# Altium schematic symbol library my Library.SchLib: 808 symbols (part 1 of 6) (continued)
## 74245 (continued)

## 74573
designator IC?, comment 74HC573
Octal D-Type Latch with 3-State Output Non-Inverting; Value: 74HC573; Copyright by: VanDungEvn@Gmail.com
footprint DIP20/W0.3 (DIP 20, 20 PIN, W 300mil.)
pins: 1 ~{OE} (in), 2 D1 (in), 3 D2 (in), 4 D3 (in), 5 D4 (in), 6 D5 (in), 7 D6 (in), 8 D7 (in), 9 D8 (in), 10 GND (power) hidden to GND, 11 LE (in), 12 Q8 (hiz), 13 Q7 (hiz), 14 Q6 (hiz), 15 Q5 (hiz), 16 Q4 (hiz), 17 Q3 (hiz), 18 Q2 (hiz), 19 Q1 (hiz), 20 VCC (power) hidden to VCC

## 74595
designator IC?, comment 74HC595
8 Bit Serial input - Parallel Output; Value: 74HC595
footprint DIP16/W0.3 (16 PIN, W 300mil, Pin to pin 100mil)
footprint SO-16 (SOIC, 16-Leads, Body 9.9x3.9mm, Pitch 1.27mm, IPC Low Density)
footprint HC595_SOP127P600X175-16N (SOP, 16-Leads, Body 9.90x3.90mm, Pitch 1.27mm, IPC Medium Density)
pins: 1 QB, 2 QC, 3 QD, 4 QE, 5 QF, 6 QG, 7 QH, 8 GND hidden to GND, 9 SQH "OUTPUT", 10 ~{MR} "OUTPUT", 11 SCK "OUTPUT", 12 LAT "OUTPUT", 13 ~{OE} "OUTPUT", 14 SDA "OUTPUT", 15 QA, 16 VCC hidden to VCC

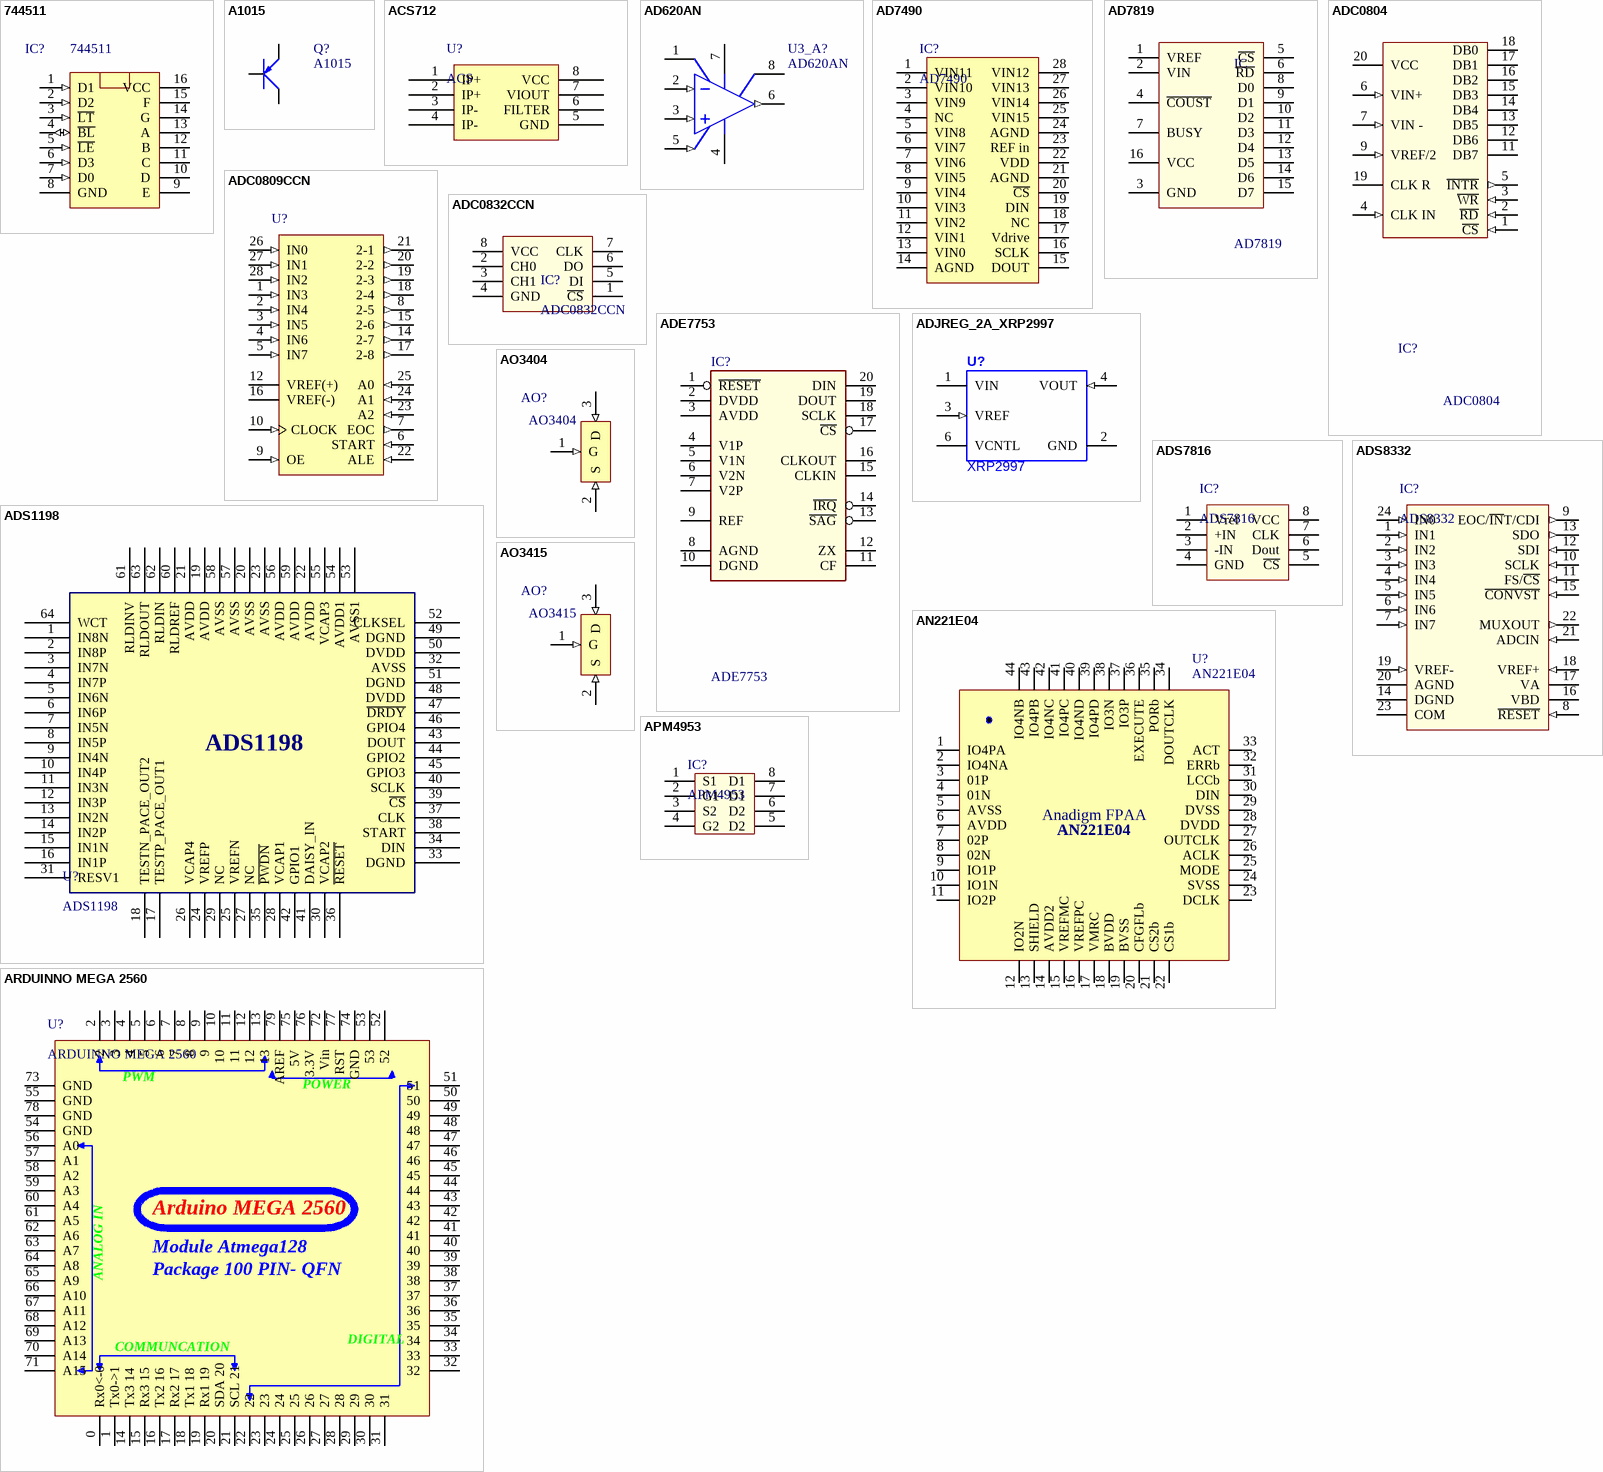
[diagram p2: symbols 744511 to ARDUINNO MEGA 2560]

## 744511
designator IC?
BCD to 7-Segment Decoder/Driver; Value: 7447 , 74247
footprint DIP16/W0.3 (16 PIN, W 300mil, Pin to pin 100mil)
pins: 1 D1 (in), 2 D2 (in), 3 ~{LT} (in), 4 ~{BL} (io), 5 ~{LE} (in), 6 D3 (in), 7 D0 (in), 8 GND (power), 9 E (oc), 10 D (oc), 11 C (oc), 12 B (oc), 13 A (oc), 14 G (oc), 15 F (oc), 16 VCC (power)

## A1015
designator Q?
PNP 600mW, ECB; Value: A1015
footprint QTO-92 (TO-92)
footprint SOT23B (SOT 23B)
pins: 1 E, 2 C, 3 B

## ACS712
designator U?, comment ACS
footprint DIP.100/8/W.300/L.400
footprint acs712 (SOIC, 8-Leads, Body 4.90x3.90mm, Pitch 1.27mm, IPC Medium Density)
pins: 1 IP+, 2 IP+, 3 IP-, 4 IP-, 5 GND, 6 FILTER, 7 VIOUT, 8 VCC

## AD620AN
designator U3_A?
Low-Cost, Low-Power Instrumentation Amplifier; Published: 8-Jun-2000; LatestRevisionDate: 04-Mar-2005; LatestRevisionNote: Stylized 3D Model Added.; DatasheetVersion: REV.D 1998; PackageVersion: revA; PackageReference: N-8; Publisher: Altium Limited; PackageDescription: DIP; 8 Leads; Row Spacing 7.62 mm; Pitch 2.54 mm; ComponentLink1Description: Manufacturer Link; ComponentLink1URL: http://www.analog.com/en/prod/0%2C2877%2CAD620%2C00.html; ComponentLink2Description: Datasheet; ComponentLink2URL: http://www.analog.com/UploadedFiles/Data_Sheets/897653854AD620_g.pdf
footprint DIP.100/8/W.300/L.400
footprint soic-8n
pins: 1 RG, 2 -IN (in), 3 +IN (in), 4 V- (power), 5 REF (in), 6 OUT (out), 7 V+ (power), 8 RG

## AD7490
designator IC?
16-Channel, 1 MSPS, 12-Bit ADC  with Sequencer in 28-Lead TSSOP
footprint TSOP65P640X120-28N (TSOP, 28-Leads, Body 9.7x4.4mm (max), Pitch 0.65mm, IPC Medium Density)
pins: 1 VIN11, 2 VIN10, 3 VIN9, 4 NC, 5 VIN8, 6 VIN7, 7 VIN6, 8 VIN5, 9 VIN4, 10 VIN3, 11 VIN2, 12 VIN1, 13 VIN0, 14 AGND, 15 DOUT, 16 SCLK, 17 Vdrive, 18 NC, 19 DIN, 20 ~{CS}, 21 AGND, 22 VDD, 23 REF in, 24 AGND, 25 VIN15, 26 VIN14, 27 VIN13, 28 VIN12

## AD7819
designator IC
8 bit A/D  Converter; Value: AD7819
footprint DIP16/W0.3 (16 PIN, W 300mil)
pins: 1 VREF, 2 VIN, 3 GND, 4 ~{COUST}, 5 ~{CS}, 6 ~{RD}, 7 BUSY, 8 D0, 9 D1, 10 D2, 11 D3, 12 D4, 13 D5, 14 D6, 15 D7, 16 VCC

## ADC0804
designator IC?
8-Bit A/D Converter (01-05); Value: ADC0804
footprint DIP20/W0.3 (DIP 20, 20 PIN, W 300mil, Pin to pin 100mil)
pins: 1 ~{CS} (in), 2 ~{RD} (in), 3 ~{WR} (in), 4 CLK IN (in), 5 ~{INTR} (out), 6 VIN+ (in), 7 VIN - (in), 8 AGND (power) hidden to GND, 9 VREF/2 (in), 10 DGND (power) hidden to GND, 11 DB7 (hiz), 12 DB6 (hiz), 13 DB5 (hiz), 14 DB4 (hiz), 15 DB3 (hiz), 16 DB2 (hiz), 17 DB1 (hiz), 18 DB0 (hiz), 19 CLK R, 20 VCC (power)

## ADC0809CCN
designator U?
8-bit Microprocessor Compatible A/D Converters With 8-Channel Multiplexer; PartNumber: ADC0809CCN; Manufacturer: National Semiconductor; CompType: ADC IC; PackageTopMarking: NSUZXYYTTE#*ADC0809CCN; Published: 27-Nov-2008; DatasheetVersion: Sep-1992; PackageVersion: revB, Aug-1993; PackageReference: NA28E; Publisher: Altium Limited; PackageDescription: Molded Dip, 28 Lead, .600 Centers, Substractor Package; RoHS: O; PinCount: 28; DigiKeyPartNumber: ADC0809CCN-ND; ComponentLink1Description: ADC0809 Datasheet; ComponentLink1URL: http://www.national.com/ds/AD/ADC0809.pdf; ComponentLink2Description: ADC0809 Web Page; ComponentLink2URL: http://www.national.com/pf/AD/ADC0809.html; ComponentLink3Description: NA28E Package Page; ComponentLink3URL: http://www.national.com/packaging/folders/na28e.html
footprint DIP28/W0.6 (DIP28/W.600, Pin to pin 100mil)
pins: 1 IN3 (in), 2 IN4 (in), 3 IN5 (in), 4 IN6 (in), 5 IN7 (in), 6 START (in), 7 EOC (out), 8 2-5 (out), 9 OE (in), 10 CLOCK (in), 11 VCC (power) hidden to VCC, 12 VREF(+) (power), 13 GND (power) hidden to GND, 14 2-7 (out), 15 2-6 (out), 16 VREF(-) (power), 17 2-8 (out), 18 2-4 (out), 19 2-3 (out), 20 2-2 (out), 21 2-1 (out), 22 ALE (in), 23 A2 (in), 24 A1 (in), 25 A0 (in), 26 IN0 (in), 27 IN1 (in), 28 IN2 (in)

## ADC0832CCN
designator IC?
Dual 8-Bit Serial I/O A/D Converters
footprint DIP8/W0.3 (8 PIN, W 300mil, Pin to pin 100mil)
pins: 1 ~{CS}, 2 CH0, 3 CH1, 4 GND, 5 DI, 6 DO, 7 CLK, 8 VCC

## ADE7753
designator IC?
Single-Phase Multifunction Metering IC with di/dt Sensor Interface
footprint TSOP65-20BN (TSOP, 20-Leads, Body 6.5x4.4mm, Pitch 0.65mm, IPC Medium Density)
pins: 1 ~{RESET}, 2 DVDD, 3 AVDD, 4 V1P, 5 V1N, 6 V2N, 7 V2P, 8 AGND, 9 REF, 10 DGND, 11 CF, 12 ZX, 13 ~{SAG}, 14 ~{IRQ}, 15 CLKIN, 16 CLKOUT, 17 ~{CS}, 18 SCLK, 19 DOUT, 20 DIN

## ADJREG_2A_XRP2997
designator U?, comment XRP2997
IC Adjustable Regulator 2A 8-SOIC-EP SMD; Manufacturer 1: Exar Corporation; Manufacturer Part Number 1: XRP2997IDBTR-F; Voltage Regulator Type: Switching Buck; Tolerance: ±20mV; Ratings: 5.5Vin Max; Value: 3.3V; 400mA; Voltage - Input: 1.1V to 5.5V; Voltage - Dropout (Typical): 0.075V @ 400mA; Current - Output: 2A (Max); SCDType: spec; Package / Case: 8-SOIC (0.154", 3.90mm Width) Exposed Pad; Voltage - Output: Adjustable; Supplier 1: Digi-Key; Supplier Part Number 1: 1016-1702-1-ND; Operating Temperature: -40°C ~ 85°C
footprint SOIC127P600X175-9N (SOIC, 8-Leads with thermal tab, Body 4.9x3.9mm, Pitch 1.27mm, IPC Medium Density)
pins: 1 VIN (power), 2 GND (power), 3 VREF (in), 4 VOUT (in), 6 VCNTL (power), 9 GND (power) hidden to GND

## ADS1198
designator U?
footprint 64A_N (Thin QFP, 64-Leads, Body 14x14mm, Pitch 0.8mm, IPC Medium Density)
pins: 1 IN8N, 2 IN8P, 3 IN7N, 4 IN7P, 5 IN6N, 6 IN6P, 7 IN5N, 8 IN5P, 9 IN4N, 10 IN4P, 11 IN3N, 12 IN3P, 13 IN2N, 14 IN2P, 15 IN1N, 16 IN1P, 17 TESTP_PACE_OUT1, 18 TESTN_PACE_OUT2, 19 AVDD, 20 AVSS, 21 AVDD, 22 AVDD, 23 AVSS, 24 VREFP, 25 VREFN, 26 VCAP4, 27 NC, 28 VCAP1, 29 NC, 30 VCAP2, 31 RESV1, 32 AVSS, 33 DGND, 34 DIN, 35 ~{PWDN}, 36 ~{RESET}, 37 CLK, 38 START, 39 ~{CS}, 40 SCLK, 41 DAISY_IN, 42 GPIO1, 43 DOUT, 44 GPIO2, 45 GPIO3, 46 GPIO4, 47 ~{DRDY}, 48 DVDD, 49 DGND, 50 DVDD, 51 DGND, 52 CLKSEL, 53 AVSS1, 54 AVDD1, 55 VCAP3, 56 AVDD, 57 AVSS, 58 AVSS, 59 AVDD, 60 RLDREF, 61 RLDINV, 62 RLDIN, 63 RLDOUT, 64 WCT

## ADS7816
designator IC?
12-Bit High Speed Micro Power Sampling  ANALOG-TO-DIGITAL CONVERTER
footprint DIP8/W0.3 (8 PIN, W 300mil, Pin to pin 100mil)
pins: 1 Vref, 2 +IN, 3 -IN, 4 GND, 5 ~{CS}, 6 Dout, 7 CLK, 8 VCC

## ADS8332
designator IC?
ADC 16bit - 8 channel - 500kSPS
footprint TSOP65-24 (TSOP, 24-Leads, Body 6.5x4.4mm, Pitch 0.65mm, IPC Medium Density)
pins: 1 IN1 (in), 2 IN2 (in), 3 IN3 (in), 4 IN4 (in), 5 IN5 (in), 6 IN6 (in), 7 IN7 (in), 8 ~{RESET} (in), 9 EOC/~{IN}T/CDI (out), 10 SCLK (in), 11 FS/~{CS} (in), 12 SDI (in), 13 SDO (out), 14 DGND, 15 ~{CONVST} (in), 16 VBD, 17 VA, 18 VREF+ (in), 19 VREF- (in), 20 AGND, 21 ADCIN (in), 22 MUXOUT (out), 23 COM, 24 IN0 (in)

## AN221E04
designator U?
Anadigm FPAA - AN221E04; Productor: Anadigm; Creator: Bien Nguyen
pins: 1 IO4PA, 2 IO4NA, 3 01P, 4 01N, 5 AVSS, 6 AVDD, 7 02P, 8 02N, 9 IO1P, 10 IO1N, 11 IO2P, 12 IO2N, 13 SHIELD, 14 AVDD2, 15 VREFMC, 16 VREFPC, 17 VMRC, 18 BVDD, 19 BVSS, 20 CFGFLb, 21 CS2b, 22 CS1b, 23 DCLK, 24 SVSS, 25 MODE, 26 ACLK, 27 OUTCLK, 28 DVDD, 29 DVSS, 30 DIN, 31 LCCb, 32 ERRb, 33 ACT, 34 DOUTCLK, 35 PORb, 36 EXECUTE, 37 IO3P, 38 IO3N, 39 IO4PD, 40 IO4ND, 41 IO4PC, 42 IO4NC, 43 IO4PB, 44 IO4NB
2 alternate drawings of the same symbol
text: Anadigm FPAA

## AO3404
designator AO3404, comment AO?
footprint SOT23-3 (SOT23, 3 pin)
pins: 1 G (in), 2 S (in), 3 D (in)

## AO3415
designator AO3415, comment AO?
footprint SOT23-3 (SOT23, 3 pin)
pins: 1 G (in), 2 S (in), 3 D (in)

## APM4953
designator IC?
Dual P-Channel Enhancement Mode MOSFET
footprint SO-8n (SOP, 8-Leads, Body 5.3x5.3mm, Pitch 1.27mm, IPC Medium Density)
pins: 1 S1, 2 G1, 3 S2, 4 G2, 5 D2, 6 D2, 7 D1, 8 D1

## ARDUINNO MEGA 2560
designator U?
footprint arduino Mega 2560
pins: 0 Rx0<-0, 1 Tx0->1, 2, 3, 4, 5, 6, 7, 8, 9, 10, 11, 12, 13, 14 Tx3 14, 15 Rx3 15, 16 Tx2 16, 17 Rx2 17, 18 Tx1 18, 19 Rx1 19, 20 SDA 20, 21 SCL 21, 22, 23, 24, 25, 26, 27, 28, 29, 30, 31, 32, 33, 34, 35, 36, 37, 38, 39, 40, 41, 42, 43, 44, 45, 46, 47, 48, 49, 50, 51, 52, 53, 54 GND, 55 GND, 56 A0, 57 A1, 58 A2, 59 A3, 60 A4, 61 A5, 62 A6, 63 A7, 64 A8, 65 A9, 66 A10, 67 A11, 68 A12, 69 A13, 70 A14, 71 A15, 72 Vin, 73 GND, 74 GND, 75 5V, 76 3.3V, 77 RST, 78 GND, 79 AREF
text: PWM; POWER; Arduino MEGA 2560; Module Atmega128; ANALOG IN; Package 100 PIN- QFN; DIGITAL; COMMUNCATION

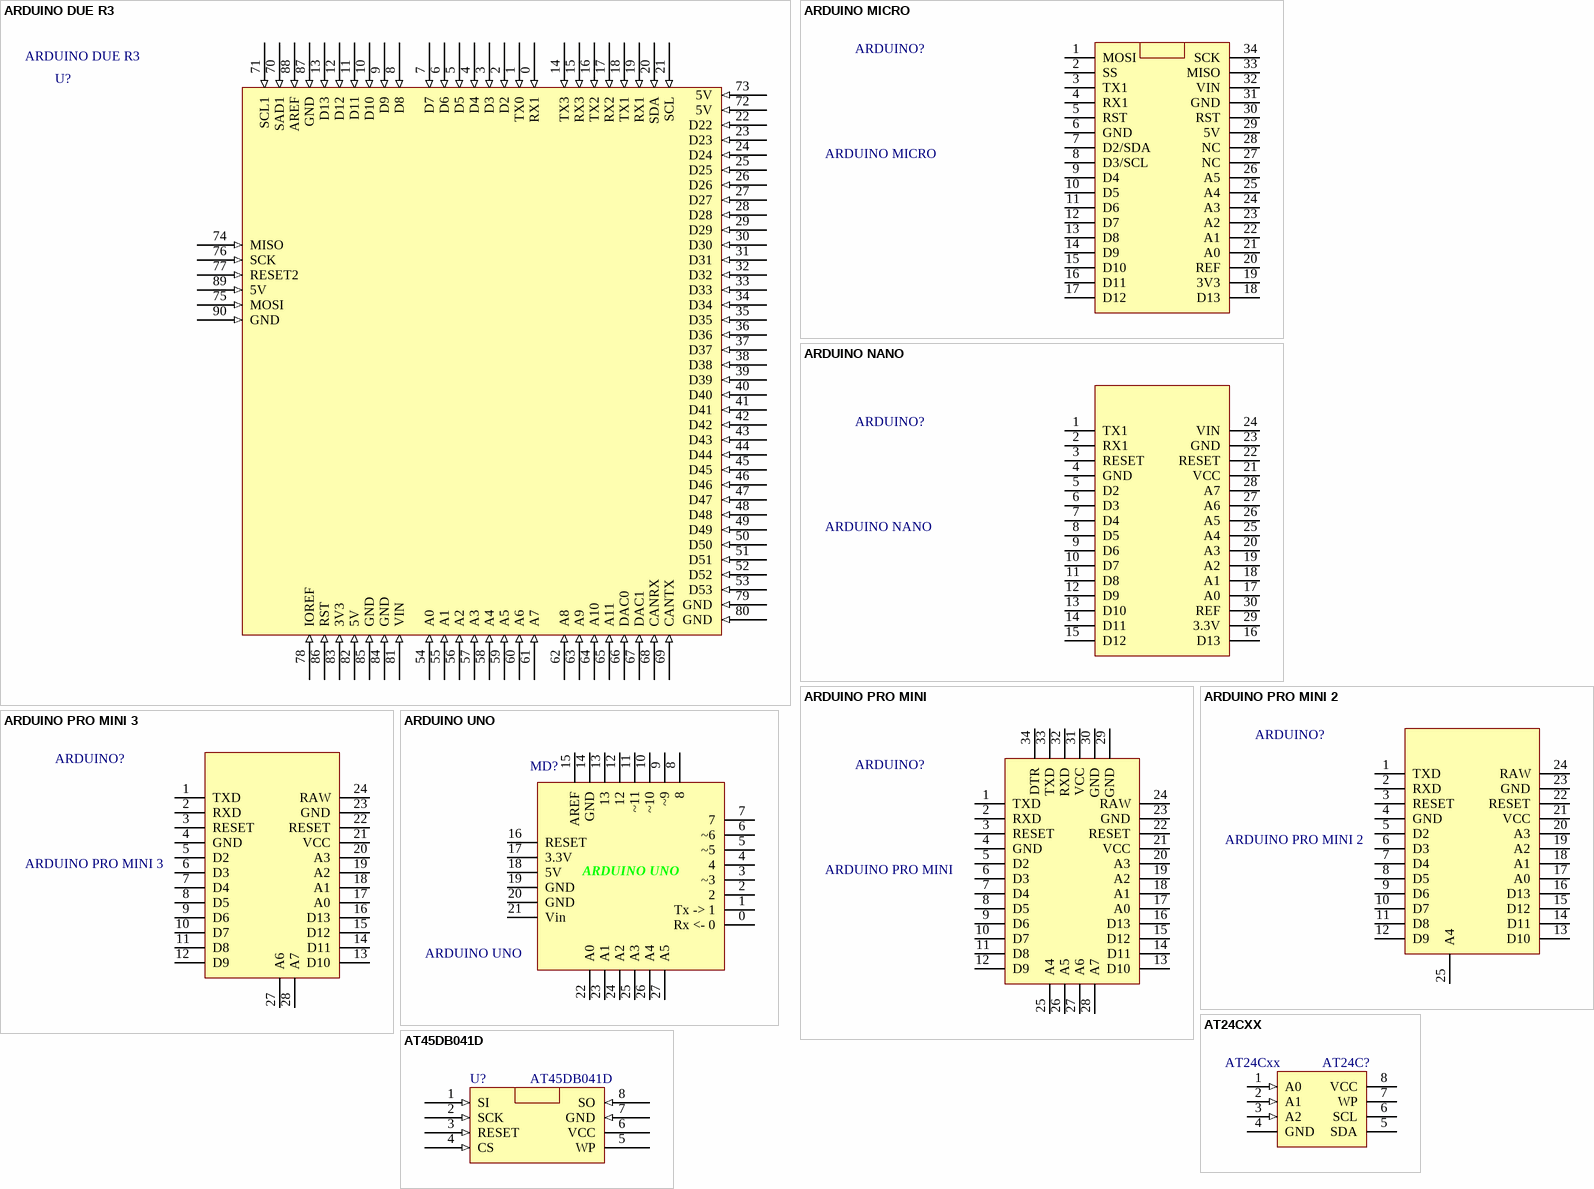
[diagram p3: symbols ARDUINO DUE R3 to AT45DB041D]

## ARDUINO DUE R3
designator U?
footprint arduino DUE
pins: 0 RX1 (in), 1 TX0 (in), 2 D2 (in), 3 D3 (in), 4 D4 (in), 5 D5 (in), 6 D6 (in), 7 D7 (in), 8 D8 (in), 9 D9 (in), 10 D10 (in), 11 D11 (in), 12 D12 (in), 13 D13 (in), 14 TX3 (in), 15 RX3 (in), 16 TX2 (in), 17 RX2 (in), 18 TX1 (in), 19 RX1 (in), 20 SDA (in), 21 SCL (in), 22 D22 (in), 23 D23 (in), 24 D24 (in), 25 D25 (in), 26 D26 (in), 27 D27 (in), 28 D28 (in), 29 D29 (in), 30 D30 (in), 31 D31 (in), 32 D32 (in), 33 D33 (in), 34 D34 (in), 35 D35 (in), 36 D36 (in), 37 D37 (in), 38 D38 (in), 39 D39 (in), 40 D40 (in), 41 D41 (in), 42 D42 (in), 43 D43 (in), 44 D44 (in), 45 D45 (in), 46 D46 (in), 47 D47 (in), 48 D48 (in), 49 D49 (in), 50 D50 (in), 51 D51 (in), 52 D52 (in), 53 D53 (in), 54 A0 (in), 55 A1 (in), 56 A2 (in), 57 A3 (in), 58 A4 (in), 59 A5 (in), 60 A6 (in), 61 A7 (in), 62 A8 (in), 63 A9 (in), 64 A10 (in), 65 A11 (in), 66 DAC0 (in), 67 DAC1 (in), 68 CANRX (in), 69 CANTX (in), 70 SAD1 (in), 71 SCL1 (in), 72 5V (in), 73 5V (in), 74 MISO (in), 75 MOSI (in), 76 SCK (in), 77 RESET2 (in), 78 IOREF (in), 79 GND (in), 80 GND (in), 81 VIN (in), 82 5V (in), 83 3V3 (in), 84 GND (in), 85 GND (in), 86 RST (in), 87 GND (in), 88 AREF (in), 89 5V (in), 90 GND (in)

## ARDUINO MICRO
designator ARDUINO?
footprint ARDUINO MICRO
pins: 1 MOSI, 2 SS, 3 TX1, 4 RX1, 5 RST, 6 GND, 7 D2/SDA, 8 D3/SCL, 9 D4, 10 D5, 11 D6, 12 D7, 13 D8, 14 D9, 15 D10, 16 D11, 17 D12, 18 D13, 19 3V3, 20 REF, 21 A0, 22 A1, 23 A2, 24 A3, 25 A4, 26 A5, 27 NC, 28 NC, 29 5V, 30 RST, 31 GND, 32 VIN, 33 MISO, 34 SCK

## ARDUINO NANO
designator ARDUINO?
footprint ARDUINO PRO NANO
pins: 1 TX1, 2 RX1, 3 RESET, 4 GND, 5 D2, 6 D3, 7 D4, 8 D5, 9 D6, 10 D7, 11 D8, 12 D9, 13 D10, 14 D11, 15 D12, 16 D13, 17 A0, 18 A1, 19 A2, 20 A3, 21 VCC, 22 RESET, 23 GND, 24 VIN, 25 A4, 26 A5, 27 A6, 28 A7, 29 3.3V, 30 REF

## ARDUINO PRO MINI
designator ARDUINO?
footprint ARDUINO PRO MINI
pins: 1 TXD, 2 RXD, 3 RESET, 4 GND, 5 D2, 6 D3, 7 D4, 8 D5, 9 D6, 10 D7, 11 D8, 12 D9, 13 D10, 14 D11, 15 D12, 16 D13, 17 A0, 18 A1, 19 A2, 20 A3, 21 VCC, 22 RESET, 23 GND, 24 RAW, 25 A4, 26 A5, 27 A6, 28 A7, 29 GND, 30 GND, 31 VCC, 32 RXD, 33 TXD, 34 DTR

## ARDUINO PRO MINI 2
designator ARDUINO?
footprint ARDUINO PRO MINI 2
pins: 1 TXD, 2 RXD, 3 RESET, 4 GND, 5 D2, 6 D3, 7 D4, 8 D5, 9 D6, 10 D7, 11 D8, 12 D9, 13 D10, 14 D11, 15 D12, 16 D13, 17 A0, 18 A1, 19 A2, 20 A3, 21 VCC, 22 RESET, 23 GND, 24 RAW, 25 A4

## ARDUINO PRO MINI 3
designator ARDUINO?
footprint ARDUINO PRO MINI 3
pins: 1 TXD, 2 RXD, 3 RESET, 4 GND, 5 D2, 6 D3, 7 D4, 8 D5, 9 D6, 10 D7, 11 D8, 12 D9, 13 D10, 14 D11, 15 D12, 16 D13, 17 A0, 18 A1, 19 A2, 20 A3, 21 VCC, 22 RESET, 23 GND, 24 RAW, 27 A6, 28 A7

## ARDUINO UNO
designator MD?
footprint ARDUINO UNO
pins: 0 Rx <- 0, 1 Tx -> 1, 2, 3 ~3, 4, 5 ~5, 6 ~6, 7, 8, 9 ~9, 10 ~10, 11 ~11, 12, 13, 14 GND, 15 AREF, 16 RESET, 17 3.3V, 18 5V, 19 GND, 20 GND, 21 Vin, 22 A0, 23 A1, 24 A2, 25 A3, 26 A4, 27 A5

## AT24CXX
designator AT24Cxx, comment AT24C?
footprint SOIC127P800X175-8N (SOIC, 8-Leads, Body 5.24x5.29mm, Pitch 1.27mm, IPC Medium Density)
pins: 1 A0 (in), 2 A1 (in), 3 A2 (in), 4 GND (power), 5 SDA, 6 SCL, 7 WP, 8 VCC (power)

## AT45DB041D
designator U?
footprint AT45DB041D (SOIC, 8-Leads, Body 5.27x5.30mm, Pitch 1.27mm, IPC Medium Density)
pins: 1 SI (in), 2 SCK (in), 3 RESET (in), 4 CS (in), 5 WP (power), 6 VCC (power), 7 GND (in), 8 SO (in)

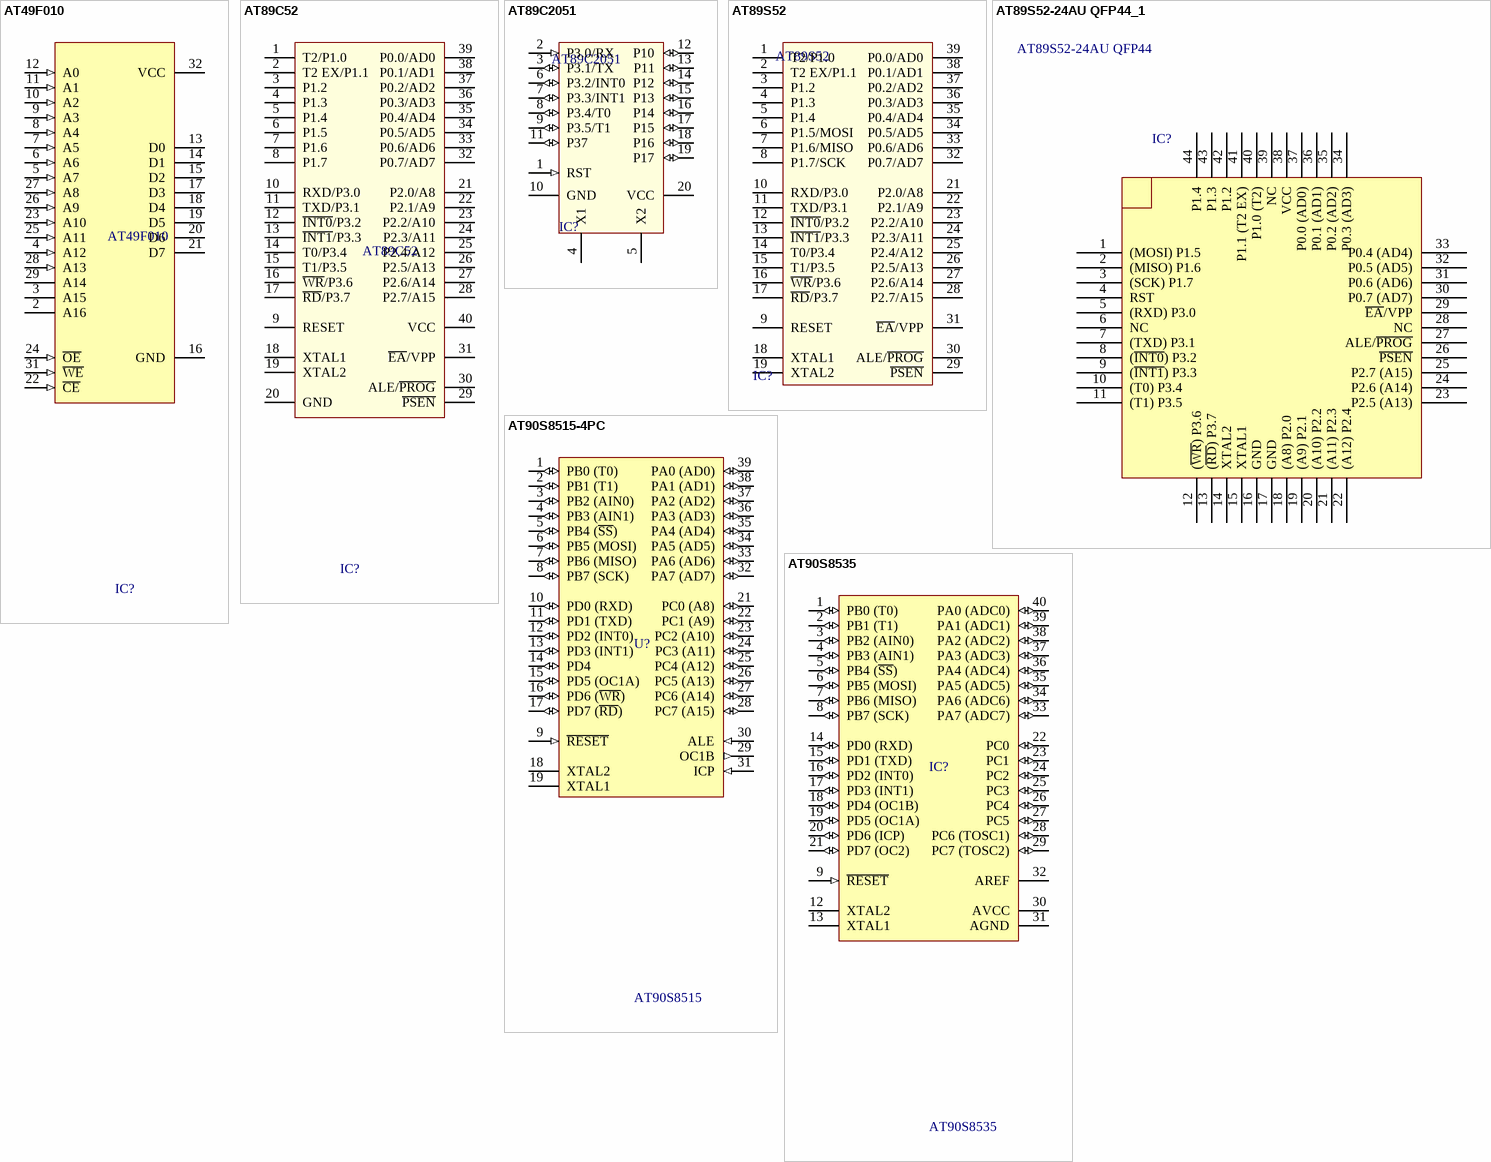
[diagram p4: symbols AT49F010 to AT90S8535]

## AT49F010
designator IC?
Value: AT49F010
footprint DIP32/W0.6 (DIP32/W.600, Pin to pin 100mil)
pins: 2 A16, 3 A15, 4 A12 (in), 5 A7 (in), 6 A6 (in), 7 A5 (in), 8 A4 (in), 9 A3 (in), 10 A2 (in), 11 A1 (in), 12 A0 (in), 13 D0 (hiz), 14 D1 (hiz), 15 D2 (hiz), 16 GND, 17 D3 (hiz), 18 D4 (hiz), 19 D5 (hiz), 20 D6 (hiz), 21 D7 (hiz), 22 ~{CE} (in), 23 A10 (in), 24 ~{OE} (in), 25 A11 (in), 26 A9 (in), 27 A8 (in), 28 A13 (in), 29 A14, 31 ~{WE} (in), 32 VCC

## AT89C52
designator IC?
Atmel AT89C52, 8k Byte Flash Memory , 40 Pin; Value: AT89C52
footprint DIP40/W0.6 (40 PIN, W 600mil, Pin to pin 100mil)
pins: 1 T2/P1.0, 2 T2 EX/P1.1, 3 P1.2, 4 P1.3, 5 P1.4, 6 P1.5, 7 P1.6, 8 P1.7, 9 RESET, 10 RXD/P3.0, 11 TXD/P3.1, 12 ~{INT0}/P3.2, 13 ~{INT1}/P3.3, 14 T0/P3.4, 15 T1/P3.5, 16 ~{WR}/P3.6, 17 ~{RD}/P3.7, 18 XTAL1, 19 XTAL2, 20 GND (oe), 21 P2.0/A8, 22 P2.1/A9, 23 P2.2/A10, 24 P2.3/A11, 25 P2.4/A12, 26 P2.5/A13, 27 P2.6/A14, 28 P2.7/A15, 29 ~{PSEN}, 30 ALE/~{PROG}, 31 ~{EA}/VPP, 32 P0.7/AD7, 33 P0.6/AD6, 34 P0.5/AD5, 35 P0.4/AD4, 36 P0.3/AD3, 37 P0.2/AD2, 38 P0.1/AD1, 39 P0.0/AD0, 40 VCC (power)

## AT89C2051
designator IC?
AT89C2051, 4k Flash Memory , 20 Pin; Value: DIP20/W0.3; Value: AT89C2051
footprint DIP20/W0.3 (DIP 20, 20 PIN, W 300mil, Pin to pin 100mil)
pins: 1 RST (in), 2 P3.0/RX (in), 3 P3.1/TX (io), 4 X1, 5 X2, 6 P3.2/INT0 (io), 7 P3.3/INT1 (io), 8 P3.4/T0 (io), 9 P3.5/T1 (io), 10 GND, 11 P37 (io), 12 P10 (io), 13 P11 (io), 14 P12 (io), 15 P13 (io), 16 P14 (io), 17 P15 (io), 18 P16 (io), 19 P17 (io), 20 VCC

## AT89S52
designator IC?
AT89S52, 8k Byte Flash Memory , 40 Pin; Value: AT89S52
footprint DIP40/W0.6 (40 PIN, W 600mil, Pin to pin 100mil)
pins: 1 T2/P1.0, 2 T2 EX/P1.1, 3 P1.2, 4 P1.3, 5 P1.4, 6 P1.5/MOSI, 7 P1.6/MISO, 8 P1.7/SCK, 9 RESET, 10 RXD/P3.0, 11 TXD/P3.1, 12 ~{INT0}/P3.2, 13 ~{INT1}/P3.3, 14 T0/P3.4, 15 T1/P3.5, 16 ~{WR}/P3.6, 17 ~{RD}/P3.7, 18 XTAL1, 19 XTAL2, 20 GND (power) hidden to GND, 21 P2.0/A8, 22 P2.1/A9, 23 P2.2/A10, 24 P2.3/A11, 25 P2.4/A12, 26 P2.5/A13, 27 P2.6/A14, 28 P2.7/A15, 29 ~{PSEN}, 30 ALE/~{PROG}, 31 ~{EA}/VPP, 32 P0.7/AD7, 33 P0.6/AD6, 34 P0.5/AD5, 35 P0.4/AD4, 36 P0.3/AD3, 37 P0.2/AD2, 38 P0.1/AD1, 39 P0.0/AD0, 40 VCC (power) hidden to VCC

## AT89S52-24AU QFP44_1
designator IC?, comment AT89S52-24AU QFP44
AT89S52, 8k Byte Flash Memory , 40 Pin; Value: AT89S52
footprint AT89S52-24AU QFP44 (TQFP, 44-Leads, Body 10.00x10.00mm, Pitch 0.80mm, IPC Medium Density)
pins: 1 (MOSI) P1.5, 2 (MISO) P1.6, 3 (SCK) P1.7, 4 RST, 5 (RXD) P3.0, 6 NC, 7 (TXD) P3.1, 8 (~{INT0}) P3.2, 9 (~{INT1}) P3.3, 10 (T0) P3.4, 11 (T1) P3.5, 12 (~{WR}) P3.6, 13 (~{RD}) P3.7, 14 XTAL2, 15 XTAL1, 16 GND, 17 GND, 18 (A8) P2.0  , 19 (A9) P2.1, 20 (A10) P2.2, 21 (A11) P2.3, 22 (A12) P2.4, 23 P2.5 (A13), 24 P2.6 (A14), 25 P2.7 (A15), 26 ~{PSEN}, 27 ALE/~{PROG}, 28 NC, 29 ~{EA}/VPP, 30 P0.7 (AD7), 31 P0.6 (AD6), 32 P0.5 (AD5), 33 P0.4 (AD4), 34 P0.3 (AD3), 35 P0.2 (AD2), 36 P0.1 (AD1), 37 P0.0 (AD0), 38 VCC, 39 NC, 40 P1.0 (T2), 41 P1.1 (T2 EX), 42 P1.2, 43 P1.3 (power), 44 P1.4 (power)

## AT90S8515-4PC
designator U?, comment AT90S8515
8-Bit AVR Microcontroller with 8K Bytes of In-System Programmable Flash Memory; Published: 17-Sep-2003; LatestRevisionDate: 04-Mar-2005; LatestRevisionNote: Stylized 3D Model Added.; DatasheetVersion: 0841G-09/01; PackageVersion: Dec-1999; PackageReference: 40P6; Publisher: Altium Limited; PackageDescription: DIP; 40 Leads; Row Spacing 15.24 mm; Pitch 2.54 mm; ComponentLink1Description: Manufacturer Link; ComponentLink1URL: http://www.atmel.com; ComponentLink2Description: Datasheet; ComponentLink2URL: http://www.atmel.com/dyn/resources/prod_documents/doc0841.pdf
footprint DIP40/W0.6 (40 PIN, W 600mil, Pin to pin 100mil)
pins: 1 PB0 (T0) (io), 2 PB1 (T1) (io), 3 PB2 (AIN0) (io), 4 PB3 (AIN1) (io), 5 PB4 (~{SS}) (io), 6 PB5 (MOSI) (io), 7 PB6 (MISO) (io), 8 PB7 (SCK) (io), 9 ~{RESET} (in), 10 PD0 (RXD) (io), 11 PD1 (TXD) (io), 12 PD2 (INT0) (io), 13 PD3 (INT1) (io), 14 PD4 (io), 15 PD5 (OC1A) (io), 16 PD6 (~{WR}) (io), 17 PD7 (~{RD}) (io), 18 XTAL2, 19 XTAL1, 20 GND (power) hidden to GND, 21 PC0 (A8) (io), 22 PC1 (A9) (io), 23 PC2 (A10) (io), 24 PC3 (A11) (io), 25 PC4 (A12) (io), 26 PC5 (A13) (io), 27 PC6 (A14) (io), 28 PC7 (A15) (io), 29 OC1B (out), 30 ALE (in), 31 ICP (in), 32 PA7 (AD7) (io), 33 PA6 (AD6) (io), 34 PA5 (AD5) (io), 35 PA4 (AD4) (io), 36 PA3 (AD3) (io), 37 PA2 (AD2) (io), 38 PA1 (AD1) (io), 39 PA0 (AD0) (io), 40 VCC (power) hidden to VCC

## AT90S8535
designator IC?
8-Bit AVR Microcontroller with 8K Bytes of In-System Programmable Flash Memory; Value: AT90S8535
footprint DIP40/W0.6 (40 PIN, W 600mil, Pin to pin 100mil)
pins: 1 PB0 (T0) (io), 2 PB1 (T1) (io), 3 PB2 (AIN0) (io), 4 PB3 (AIN1) (io), 5 PB4 (~{SS}) (io), 6 PB5 (MOSI) (io), 7 PB6 (MISO) (io), 8 PB7 (SCK) (io), 9 ~{RESET} (in), 10 VCC (power) hidden to VCC, 11 GND (power) hidden to GND, 12 XTAL2, 13 XTAL1, 14 PD0 (RXD) (io), 15 PD1 (TXD) (io), 16 PD2 (INT0) (io), 17 PD3 (INT1) (io), 18 PD4 (OC1B) (io), 19 PD5 (OC1A) (io), 20 PD6 (ICP) (io), 21 PD7 (OC2) (io), 22 PC0 (io), 23 PC1 (io), 24 PC2 (io), 25 PC3 (io), 26 PC4 (io), 27 PC5 (io), 28 PC6 (TOSC1) (io), 29 PC7 (TOSC2) (io), 30 AVCC (power), 31 AGND (power), 32 AREF, 33 PA7 (ADC7) (io), 34 PA6 (ADC6) (io), 35 PA5 (ADC5) (io), 36 PA4 (ADC4) (io), 37 PA3 (ADC3) (io), 38 PA2 (ADC2) (io), 39 PA1 (ADC1) (io), 40 PA0 (ADC0) (io)
